# Altium footprint library 红旗_PcbLib_V1.0.PcbLib: 66 footprints (part 1 of 5)
Each footprint in its own frame and in the unit in brackets; x right, y up, seen from the top. Pads: shape width x height; smd on the part's side, far side on the other; paste and mask are expansions set on the pad; w line width, h text height; cw(c..) or ccw(c..) is an arc to the next point about the centre after c.
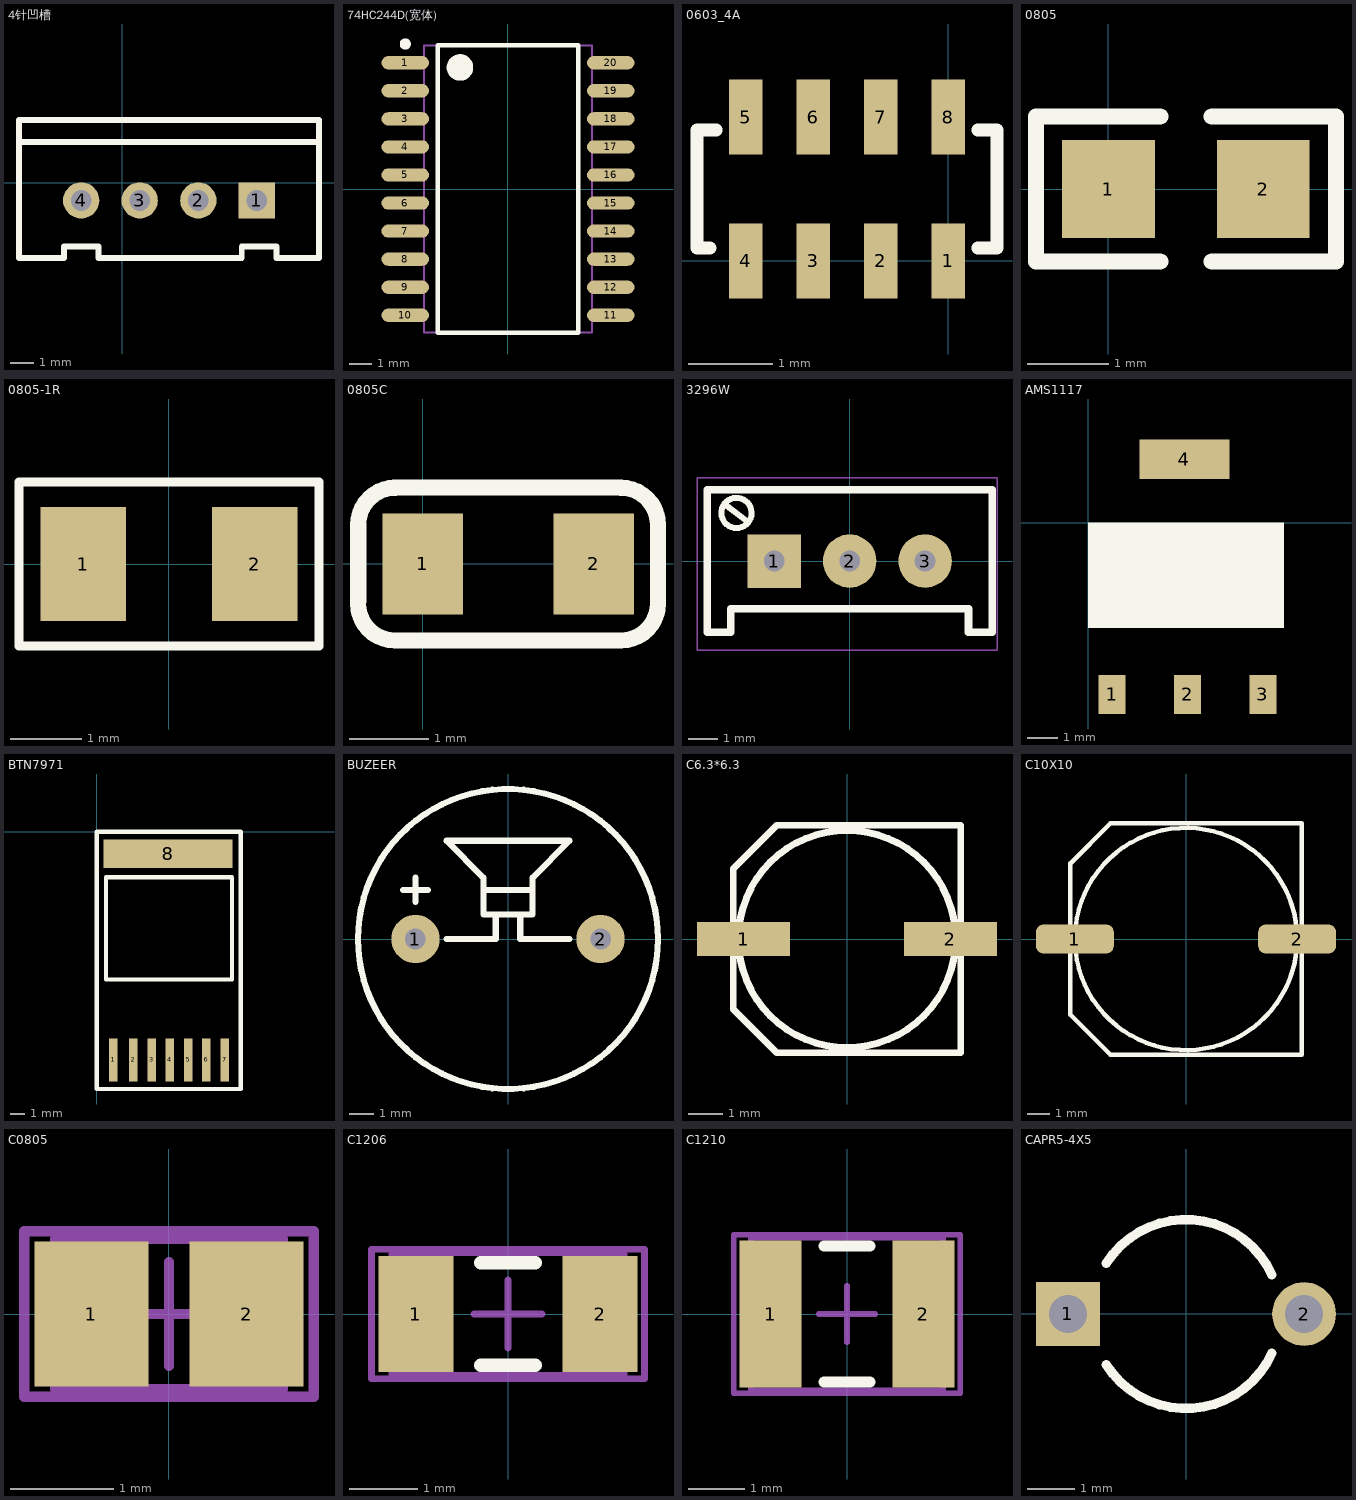
[diagram p0: the footprints below, top view; thin cyan lines are the x and y axes]

## 4针凹槽 [mil]
pads (4):
  rect 62x62 hole 35.43: 1(230,-30)
  round 62 hole 35.43: 2(130,-30) 3(30,-30) 4(-70,-30)
Top Overlay:
  lines w10: -172.48,69.84 -76.3,69.84 334.72,69.84 ; 334.72,107.64 -76.3,107.64 -176.3,107.64 -176.3,-128.58 -99.53,-128.58 -99.53,-108.9 -40.47,-108.9 -40.47,-128.58 104.41,-128.58 204.41,-128.58 204.41,-108.9 263.46,-108.9 263.46,-128.58 336.3,-128.58 336.3,107.64
3D body "User Library-B4B-XH-A.STEP": height 279.53, standoff -129.92, extent -164.09,-122.51 324.1,103.87

## 74HC244D(宽体) [mm]
pads (20):
  oval 2.15x0.6 smd: 1(-4.65,5.715) 2(-4.65,4.445) 3(-4.65,3.175) 4(-4.65,1.905) 5(-4.65,0.635) 6(-4.65,-0.635) 7(-4.65,-1.905) 8(-4.65,-3.175) 9(-4.65,-4.445) 10(-4.65,-5.715) 11(4.65,-5.715) 12(4.65,-4.445) 13(4.65,-3.175) 14(4.65,-1.905) 15(4.65,-0.635) 16(4.65,0.635) 17(4.65,1.905) 18(4.65,3.175) 19(4.65,4.445) 20(4.65,5.715)
Top Overlay:
  circle w0.25: c-4.65,6.565 r0.125
  circle w0.6: c-2.175,5.5 r0.3
  lines w0.2: -3.175,-6.5 -3.175,6.5 3.175,6.5 3.175,-6.5 -3.175,-6.5
Mechanical 13:
  lines w0.1: -3.8,-6.5 -3.8,6.5 3.8,6.5 3.8,-6.5 -3.8,-6.5

## 0603_4A [mm]
pads (8):
  rect 0.4x0.889 smd: 1(0,0) 2(-0.8,0) 3(-1.6,0) 4(-2.4,0) 5(-2.4,1.702) 6(-1.6,1.702) 7(-0.8,1.702) 8(0,1.702)
Top Overlay:
  lines w0.152: -2.826,0.152 -2.978,0.152 -2.978,1.549 -2.749,1.549 ; 0.349,0.152 0.578,0.152 0.578,1.549 ; 0.349,1.549 0.553,1.549

## 0805 [mm]
pads (2):
  rect 1.14x1.2 smd: 1(0,0) 2(1.9,0)
Top Overlay:
  lines w0.2: 0.635,-0.889 -0.889,-0.889 -0.889,0.889 0.635,0.889 ; 1.27,-0.889 2.794,-0.889 2.794,0.889 1.27,0.889

## 0805-1R [mm]
pads (2):
  rect 1.2x1.6 smd: 1(-1.2,0) 2(1.2,0)
Top Overlay:
  lines w0.127: -2.1,-1.15 -2.1,1.15 2.1,1.15 2.1,-1.15 -2.1,-1.15
3D body "User Library-RES_2013-0805.STEP": height 0.76, standoff 0, extent -1.09,-0.645 1.21,0.705

## 0805C [mil]
pads (2):
  rect 40x50 smd: 1(0,0) 2(85,0)
Top Overlay:
  lines w8: -32.11,-19.59 ccw(c-13.7,-19.59) -13.7,-38 ; -32,-18.5 -32,18.5 ; -32,19.5 cw(c-13.59,19.5) -13.59,37.91 ; -14.12,38 98.09,38 ; -12.7,-38 98.11,-38 ; 98.59,-38 ccw(c98.59,-19.59) 117,-19.59 ; 98.59,37.91 cw(c98.59,19.5) 117,19.5 ; 117,-18.59 117,18.5
3D body "User Library-0805 SMD Capacitor.STEP": height 30.39, standoff -0.39, extent 3.15,-24.61 81.89,24.61

## 3296W [mm] "Precise Multi-Winding Adjustable Resistor"
pads (3):
  rect 1.8x1.8 hole 0.7: 1(-2.54,0)
  round 1.8 hole 0.7: 2(0,0) 3(2.54,0)
Top Overlay:
  lines w0.2: -3.302,1.651 ccw(c-3.81,1.618) -3.301,1.608
  lines w0.203: -4.2,1.9 -3.464,1.348
  lines w0.254: -4.8,-2.4 -4.8,2.4 4.8,2.4 4.8,-2.4 4,-2.4 4,-1.6 -4,-1.6 -4,-2.4 -4.8,-2.4
Mechanical 15:
  lines w0.05: -5.14,-3 4.96,-3 4.96,2.8 -5.14,2.8 -5.14,-3
3D body "3296.STEP": height 11.52, standoff -3.48, extent -4.75,-2.4 4.75,2.4

## AMS1117 [mm]
pads (4):
  rect 0.9x1.3 smd: 1(0.8,-5.7) 2(3.3,-5.7) 3(5.8,-5.7)
  rect 3x1.3 smd: 4(3.2,2.1)
Top Overlay:
  rectangle: 0,-3.5 6.5,0

## BTN7971 [mm]
pads (8):
  rect 0.6x3 smd: 1(1.143,-15.875) 2(2.54,-15.875) 3(3.81,-15.875) 4(5.08,-15.875) 5(6.35,-15.875) 6(7.62,-15.875) 7(8.89,-15.875)
  rect 9x2 smd: 8(4.953,-1.524)
Top Overlay:
  lines w0.305: 0,-17.907 0,0 10,0 10,-17.907 0,-17.907 ; 0.635,-10.287 0.635,-3.175 9.398,-3.175 9.398,-10.287 0.635,-10.287

## BUZEER [mm]
pads (2):
  round 2 hole 0.85: 1(-3.825,0) 2(3.825,0)
Top Overlay:
  circle w0.254: c0,0 r6.2
  lines w0.254: -4.333,2.032 -3.317,2.032 ; -3.825,1.524 -3.825,2.54 ; -2.54,0 -0.508,0 -0.508,1.016 ; -1.016,2.032 1.016,2.032 ; 0.508,1.016 0.508,0 2.54,0 ; -2.54,4.064 2.54,4.064 1.016,2.54 1.016,1.016 -1.016,1.016 -1.016,2.54 -2.54,4.064
3D body "SW3dPS-WST-1203UX.STEP": height 9.65, standoff -4.5, extent -9.708,-6.127 5.746,5.873

## C6.3*6.3 [mm]
pads (2):
  rect 2.7x1 smd: 1(-3,0) 2(3,0)
Top Overlay:
  circle w0.2: c0,0 r3.15
  lines w0.2: -3.3,2.032 -3.3,-2.032 -2.032,-3.3 3.3,-3.3 3.3,3.3 -2.032,3.3 -3.287,2.045
3D body "SL-E.step": height 5.2, standoff 0, extent -3.5,-3.302 3.5,3.298

## C10X10 [mm]
height 10
pads (2):
  rrect50% 3.5x1.3 smd: 1(-5,0) 2(5,0)
Top Overlay:
  circle w0.2: c0,0 r5
  lines w0.2: -5.2,3.404 -5.2,-3.404 -3.404,-5.2 5.2,-5.2 5.2,5.2 -3.404,5.2 -5.191,3.413
3D body "SW3dPS-capacitor size G.STEP": height 10.21, standoff -0.01, extent -5.775,-5.118 5.825,5.182

## C0805 [mm] "Chip Capacitor, Body 2.0x1.3mm, IPC High Density"
height 1.4
pads (2):
  rect 1.1x1.4 smd: 1(-0.75,0) 2(0.75,0)
Mechanical 13:
  lines w0.1: -1.1,-0.725 -1.1,0.725 1.1,0.725 1.1,-0.725 -1.1,-0.725
Mechanical 15:
  lines w0.1: -0.5,0 0.5,0 ; 0,-0.5 0,0.5 ; -1.4,-0.8 -1.4,0.8 1.4,0.8 1.4,-0.8 -1.4,-0.8
3D body: height 1.4, standoff 0, extent -1.1,-0.725 1.1,0.725

## C1206 [mm] "Chip Capacitor, Body 3.2x1.6mm, IPC High Density"
height 1.3
pads (2):
  rect 1.1x1.7 smd: 1(-1.35,0) 2(1.35,0)
Top Overlay:
  lines w0.2: -0.4,-0.75 0.4,-0.75 ; -0.4,0.75 0.4,0.75
Mechanical 13:
  lines w0.1: -1.7,-0.9 -1.7,0.9 1.7,0.9 1.7,-0.9 -1.7,-0.9
Mechanical 15:
  lines w0.1: -0.5,0 0.5,0 ; 0,-0.5 0,0.5 ; -2,-0.95 -2,0.95 2,0.95 2,-0.95 -2,-0.95
3D body: height 1.3, standoff 0, extent -1.7,-0.9 1.7,0.9

## C1210 [mm] "Chip Capacitor, Body 3.2x2.5mm, IPC High Density"
height 1.3
pads (2):
  rect 1.1x2.6 smd: 1(-1.35,0) 2(1.35,0)
Top Overlay:
  lines w0.2: -0.4,-1.2 0.4,-1.2 ; -0.4,1.2 0.4,1.2
Mechanical 13:
  lines w0.1: -1.7,-1.35 -1.7,1.35 1.7,1.35 1.7,-1.35 -1.7,-1.35
Mechanical 15:
  lines w0.1: -0.5,0 0.5,0 ; 0,-0.5 0,0.5 ; -2,-1.4 -2,1.4 2,1.4 2,-1.4 -2,-1.4
3D body: height 1.3, standoff 0, extent -1.7,-1.35 1.7,1.35

## CAPR5-4X5 [mm] "Capacitor; 2 Leads"
height 12
pads (2):
  rect 1.35x1.35 hole 0.8: 1(-2.5,0)
  round 1.35 hole 0.8: 2(2.5,0)
Top Overlay:
  lines w0.2: -1.687,-1.075 ccw(c0,0) 1.819,-0.832 ; -1.687,1.075 cw(c0,0) 1.819,0.832